# Altium footprint library PCB_ConnectorHDR.PcbLib: 221 footprints (part 11 of 14)
Each footprint in its own frame and in the unit in brackets; x right, y up, seen from the top. Pads: shape width x height; smd on the part's side, far side on the other; paste and mask are expansions set on the pad; w line width, h text height; cw(c..) or ccw(c..) is an arc to the next point about the centre after c.
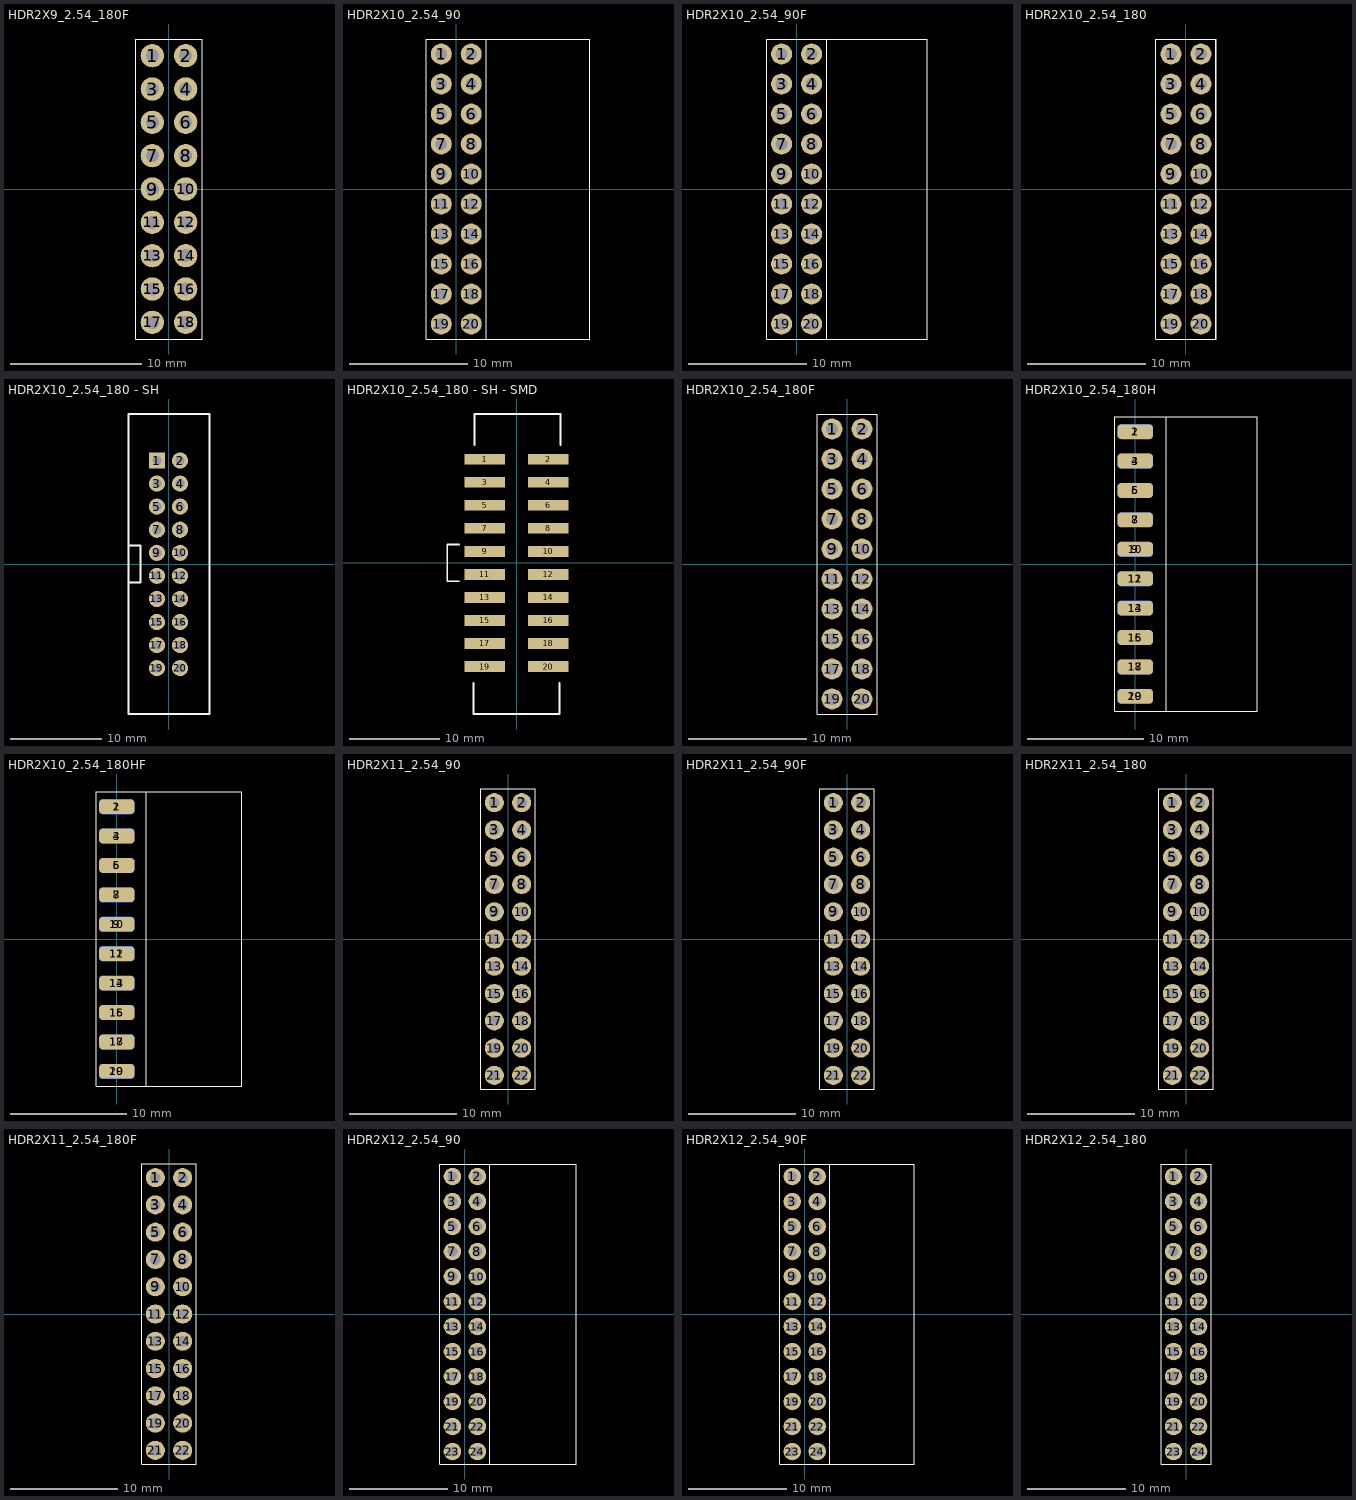
[diagram p10: the footprints below, top view; thin cyan lines are the x and y axes]

## HDR2X9_2.54_180F [mil]
height 169.29
pads (18):
  round 70 hole 39.37: 1(-50,400) 2(50,400) 3(-50,300) 4(50,300) 5(-50,200) 6(50,200) 7(-50,100) 8(50,100) 9(-50,0) 10(50,0) 11(-50,-100) 12(50,-100) 13(-50,-200) 14(50,-200) 15(-50,-300) 16(50,-300) 17(-50,-400) 18(50,-400)
Top Overlay:
  lines w2: -100,-450 100,-450 ; -100,-450 -100,450 ; -100,-450 100,-450 ; -100,-450 -100,450 ; -100,450 100,450 ; -100,450 100,450 ; 100,-450 100,450 ; 100,-450 100,450
3D body "female_header_a-bl254-dg-g18d.stp": height 334.65, standoff -125.98, extent -98,-455.84 98.85,454

## HDR2X10_2.54_90 [mil]
height 169.29
pads (20):
  round 70 hole 39.37: 1(-50,450) 2(50,450) 3(-50,350) 4(50,350) 5(-50,250) 6(50,250) 7(-50,150) 8(50,150) 9(-50,50) 10(50,50) 11(-50,-50) 12(50,-50) 13(-50,-150) 14(50,-150) 15(-50,-250) 16(50,-250) 17(-50,-350) 18(50,-350) 19(-50,-450) 20(50,-450)
Top Overlay:
  lines w2: -100,-500 445,-500 445,500 -100,500 ; -100,-500 -100,500 ; -100,-500 -100,500 ; -100,-500 100,-500 100,500 -100,500
3D body "pin_header_awl254-da-g20d.stp": height 198.43, standoff -116.54, extent -62.44,-500 444.65,500

## HDR2X10_2.54_90F [mil]
height 169.29
pads (20):
  round 70 hole 39.37: 1(-50,450) 2(50,450) 3(-50,350) 4(50,350) 5(-50,250) 6(50,250) 7(-50,150) 8(50,150) 9(-50,50) 10(50,50) 11(-50,-50) 12(50,-50) 13(-50,-150) 14(50,-150) 15(-50,-250) 16(50,-250) 17(-50,-350) 18(50,-350) 19(-50,-450) 20(50,-450)
Top Overlay:
  lines w2: -100,-500 -100,500 ; -100,-500 436,-500 436,500 -100,500 ; -100,-500 -100,500 ; -100,-500 100,-500 100,500 -100,500
3D body "female_header_a-bl254-da-g20d.stp": height 198.43, standoff -124.41, extent -60,-504.92 436.06,504.92

## HDR2X10_2.54_180 [mil]
height 169.29
pads (20):
  round 70 hole 39.37: 1(-50,450) 2(50,450) 3(-50,350) 4(50,350) 5(-50,250) 6(50,250) 7(-50,150) 8(50,150) 9(-50,50) 10(50,50) 11(-50,-50) 12(50,-50) 13(-50,-150) 14(50,-150) 15(-50,-250) 16(50,-250) 17(-50,-350) 18(50,-350) 19(-50,-450) 20(50,-450)
Top Overlay:
  lines w2: -100,-500 -100,500 ; -100,-500 100,-500 ; -100,-500 -100,500 ; -100,-500 100,-500 ; -100,500 100,500 ; -100,500 100,500 ; 100,-500 100,500 ; 100,-500 100,500
3D body "pin_header_awl254-dg-g20d.stp": height 334.65, standoff -118.11, extent -100,-500 100,500

## HDR2X10_2.54_180 - SH [mil]
height 169.29
pads (20):
  rect 70x70 hole 39.37: 1(-50,450)
  round 70 hole 39.37: 2(50,450) 3(-50,350) 4(50,350) 5(-50,250) 6(50,250) 7(-50,150) 8(50,150) 9(-50,50) 10(50,50) 11(-50,-50) 12(50,-50) 13(-50,-150) 14(50,-150) 15(-50,-250) 16(50,-250) 17(-50,-350) 18(50,-350) 19(-50,-450) 20(50,-450)
Top Overlay:
  lines w7.87: -172.81,-78.91 -121.4,-78.91 -121.4,81.23 -172.81,81.23 ; -100,-648.52 177.12,-648.52 177.12,651.63 -172.81,651.63 -172.81,-648.16 100,-648.16
3D body "702462001.step": height 365.46, standoff -134.5, extent -172.76,-648.88 177.24,651.12

## HDR2X10_2.54_180 - SH - SMD [mm]
height 4.3
pads (20):
  rect 4.5x1.2 smd: 1(-3.5,11.43) 2(3.5,11.43) 3(-3.5,8.89) 4(3.5,8.89) 5(-3.5,6.35) 6(3.5,6.35) 7(-3.5,3.81) 8(3.5,3.81) 9(-3.5,1.27) 10(3.5,1.27) 11(-3.5,-1.27) 12(3.5,-1.27) 13(-3.5,-3.81) 14(3.5,-3.81) 15(-3.5,-6.35) 16(3.5,-6.35) 17(-3.5,-8.89) 18(3.5,-8.89) 19(-3.5,-11.43) 20(3.5,-11.43)
Top Overlay:
  lines w0.2: -6.335,-2.031 -7.641,-2.031 -7.641,2.036 -6.335,2.036 ; -4.74,-13.237 -4.74,-16.667 4.738,-16.667 4.738,-13.237 ; -4.629,12.985 -4.629,16.415 4.849,16.415 4.849,12.985 ; 4.738,-13.237 4.738,-13.237 ; 4.849,12.985 4.849,12.985
3D body "61202020621_Download_STP_61202020621_rev1 (2).stp": height 10.43, standoff 0.01, extent -4.695,-16.618 4.805,16.402

## HDR2X10_2.54_180F [mil]
height 169.29
pads (20):
  round 70 hole 39.37: 1(-50,450) 2(50,450) 3(-50,350) 4(50,350) 5(-50,250) 6(50,250) 7(-50,150) 8(50,150) 9(-50,50) 10(50,50) 11(-50,-50) 12(50,-50) 13(-50,-150) 14(50,-150) 15(-50,-250) 16(50,-250) 17(-50,-350) 18(50,-350) 19(-50,-450) 20(50,-450)
Top Overlay:
  lines w2: -100,-500 100,-500 ; -100,-500 -100,500 ; -100,-500 100,-500 ; -100,-500 -100,500 ; -100,500 100,500 ; -100,500 100,500 ; 100,-500 100,500 ; 100,-500 100,500
3D body "female_header_a-bl254-dg-g20d.stp": height 334.65, standoff -125.98, extent -98.42,-504.92 98.43,504.92

## HDR2X10_2.54_180H [mil]
height 169.29
pads (20):
  rrect50% 120x50 smd: 1(0,450) 3(0,350) 5(0,250) 7(0,150) 9(0,50) 11(0,-50) 13(0,-150) 15(0,-250) 17(0,-350) 19(0,-450)
  rrect50% 120x50 smd far side: 2(0,450) 4(0,350) 6(0,250) 8(0,150) 10(0,50) 12(0,-50) 14(0,-150) 16(0,-250) 18(0,-350) 20(0,-450)
Top Overlay:
  lines w2: -70,-500 -70,500 ; -70,-500 105,-500 ; -70,-500 415,-500 415,500 -70,500 ; -70,-500 -70,500 ; -70,-500 105,-500 ; -70,-500 -70,500 ; -70,500 105,500 ; -70,500 105,500 ; 105,-500 105,500 ; 105,-500 105,500
3D body "pin_header_awl254-dg-g20d.stp": height 100, standoff -100, extent -37.76,-500 415,500

## HDR2X10_2.54_180HF [mil]
height 169.29
pads (20):
  rrect50% 120x50 smd: 1(0,450) 3(0,350) 5(0,250) 7(0,150) 9(0,50) 11(0,-50) 13(0,-150) 15(0,-250) 17(0,-350) 19(0,-450)
  rrect50% 120x50 smd far side: 2(0,450) 4(0,350) 6(0,250) 8(0,150) 10(0,50) 12(0,-50) 14(0,-150) 16(0,-250) 18(0,-350) 20(0,-450)
Top Overlay:
  lines w2: -70,-500 -70,500 ; -70,-500 100,-500 ; -70,-500 -70,500 ; -70,-500 425,-500 425,500 -70,500 ; -70,-500 100,-500 ; -70,-500 -70,500 ; -70,500 100,500 ; -70,500 100,500 ; 100,-500 100,500 ; 100,-500 100,500
3D body "female_header_a-bl254-dg-g20d.stp": height 88.43, standoff -108.43, extent -40.98,-504.92 419.65,504.92

## HDR2X11_2.54_90 [mil]
height 169.29
pads (22):
  round 70 hole 39.37: 1(-50,500) 2(50,500) 3(-50,400) 4(50,400) 5(-50,300) 6(50,300) 7(-50,200) 8(50,200) 9(-50,100) 10(50,100) 11(-50,0) 12(50,0) 13(-50,-100) 14(50,-100) 15(-50,-200) 16(50,-200) 17(-50,-300) 18(50,-300) 19(-50,-400) 20(50,-400) 21(-50,-500) 22(50,-500)
Top Overlay:
  lines w2: -100,-550 100,-550 ; -100,-550 -100,550 ; -100,-550 -100,550 ; -100,-550 100,-550 ; -100,550 100,550 ; -100,550 100,550 ; 100,-550 100,550 ; 100,-550 100,550
3D body "pin_header_awl254-da-g22d.stp": height 197.35, standoff -117.61, extent -63,-550 444.09,550

## HDR2X11_2.54_90F [mil]
height 169.29
pads (22):
  round 70 hole 39.37: 1(-50,500) 2(50,500) 3(-50,400) 4(50,400) 5(-50,300) 6(50,300) 7(-50,200) 8(50,200) 9(-50,100) 10(50,100) 11(-50,0) 12(50,0) 13(-50,-100) 14(50,-100) 15(-50,-200) 16(50,-200) 17(-50,-300) 18(50,-300) 19(-50,-400) 20(50,-400) 21(-50,-500) 22(50,-500)
Top Overlay:
  lines w2: -100,-550 100,-550 ; -100,-550 -100,550 ; -100,-550 -100,550 ; -100,-550 100,-550 ; -100,550 100,550 ; -100,550 100,550 ; 100,-550 100,550 ; 100,-550 100,550
3D body "female_header_A-BL254-DA-G22D.stp": height 197.35, standoff -125.48, extent -60,-554.84 436.06,555

## HDR2X11_2.54_180 [mil]
height 169.29
pads (22):
  round 70 hole 39.37: 1(-50,500) 2(50,500) 3(-50,400) 4(50,400) 5(-50,300) 6(50,300) 7(-50,200) 8(50,200) 9(-50,100) 10(50,100) 11(-50,0) 12(50,0) 13(-50,-100) 14(50,-100) 15(-50,-200) 16(50,-200) 17(-50,-300) 18(50,-300) 19(-50,-400) 20(50,-400) 21(-50,-500) 22(50,-500)
Top Overlay:
  lines w2: -100,-550 100,-550 ; -100,-550 -100,550 ; -100,-550 -100,550 ; -100,-550 100,-550 ; -100,550 100,550 ; -100,550 100,550 ; 100,-550 100,550 ; 100,-550 100,550
3D body "User Library-PLD-22.step": height 330.71, standoff -118.11, extent -98,-550 98.85,550

## HDR2X11_2.54_180F [mil]
height 169.29
pads (22):
  round 70 hole 39.37: 1(-50,500) 2(50,500) 3(-50,400) 4(50,400) 5(-50,300) 6(50,300) 7(-50,200) 8(50,200) 9(-50,100) 10(50,100) 11(-50,0) 12(50,0) 13(-50,-100) 14(50,-100) 15(-50,-200) 16(50,-200) 17(-50,-300) 18(50,-300) 19(-50,-400) 20(50,-400) 21(-50,-500) 22(50,-500)
Top Overlay:
  lines w2: -100,-550 100,-550 ; -100,-550 -100,550 ; -100,-550 -100,550 ; -100,-550 100,-550 ; -100,550 100,550 ; -100,550 100,550 ; 100,-550 100,550 ; 100,-550 100,550
3D body "female_header_a-bl254-dg-g22d.stp": height 334.65, standoff -125.98, extent -98,-556.84 98.85,553

## HDR2X12_2.54_90 [mil]
height 169.29
pads (24):
  round 70 hole 39.37: 1(-50,550) 2(50,550) 3(-50,450) 4(50,450) 5(-50,350) 6(50,350) 7(-50,250) 8(50,250) 9(-50,150) 10(50,150) 11(-50,50) 12(50,50) 13(-50,-50) 14(50,-50) 15(-50,-150) 16(50,-150) 17(-50,-250) 18(50,-250) 19(-50,-350) 20(50,-350) 21(-50,-450) 22(50,-450) 23(-50,-550) 24(50,-550)
Top Overlay:
  lines w2: -100,-600 -100,600 ; -100,-600 445,-600 445,600 -100,600 ; -100,-600 -100,600 ; -100,-600 100,-600 100,600 -100,600
3D body "pin_header_awl254-da-g24d.stp": height 197.35, standoff -117.61, extent -62,-600 445.09,600

## HDR2X12_2.54_90F [mil]
height 169.29
pads (24):
  round 70 hole 39.37: 1(-50,550) 2(50,550) 3(-50,450) 4(50,450) 5(-50,350) 6(50,350) 7(-50,250) 8(50,250) 9(-50,150) 10(50,150) 11(-50,50) 12(50,50) 13(-50,-50) 14(50,-50) 15(-50,-150) 16(50,-150) 17(-50,-250) 18(50,-250) 19(-50,-350) 20(50,-350) 21(-50,-450) 22(50,-450) 23(-50,-550) 24(50,-550)
Top Overlay:
  lines w2: -100,-600 100,-600 100,600 -100,600 ; -100,-600 -100,600 ; -100,-600 438,-600 438,600 -100,600 ; -100,-600 -100,600
3D body "female_header_A-BL254-DA-G24D.stp": height 197.35, standoff -125.48, extent -58,-604.84 438.06,605

## HDR2X12_2.54_180 [mil]
height 169.29
pads (24):
  round 70 hole 39.37: 1(-50,550) 2(50,550) 3(-50,450) 4(50,450) 5(-50,350) 6(50,350) 7(-50,250) 8(50,250) 9(-50,150) 10(50,150) 11(-50,50) 12(50,50) 13(-50,-50) 14(50,-50) 15(-50,-150) 16(50,-150) 17(-50,-250) 18(50,-250) 19(-50,-350) 20(50,-350) 21(-50,-450) 22(50,-450) 23(-50,-550) 24(50,-550)
Top Overlay:
  lines w2: -100,-600 100,-600 ; -100,-600 -100,600 ; -100,-600 -100,600 ; -100,-600 100,-600 ; -100,600 100,600 ; -100,600 100,600 ; 100,-600 100,600 ; 100,-600 100,600
3D body "User Library-PLD-24.step": height 330.71, standoff -118.11, extent -98.43,-600 98.43,600